# Altium footprint library aiskylab-14Connectors-19PWRCon.PcbLib: 63 footprints (part 1 of 4)
Each footprint in its own frame and in the unit in brackets; x right, y up, seen from the top. Pads: shape width x height; smd on the part's side, far side on the other; paste and mask are expansions set on the pad; w line width, h text height; cw(c..) or ccw(c..) is an arc to the next point about the centre after c.
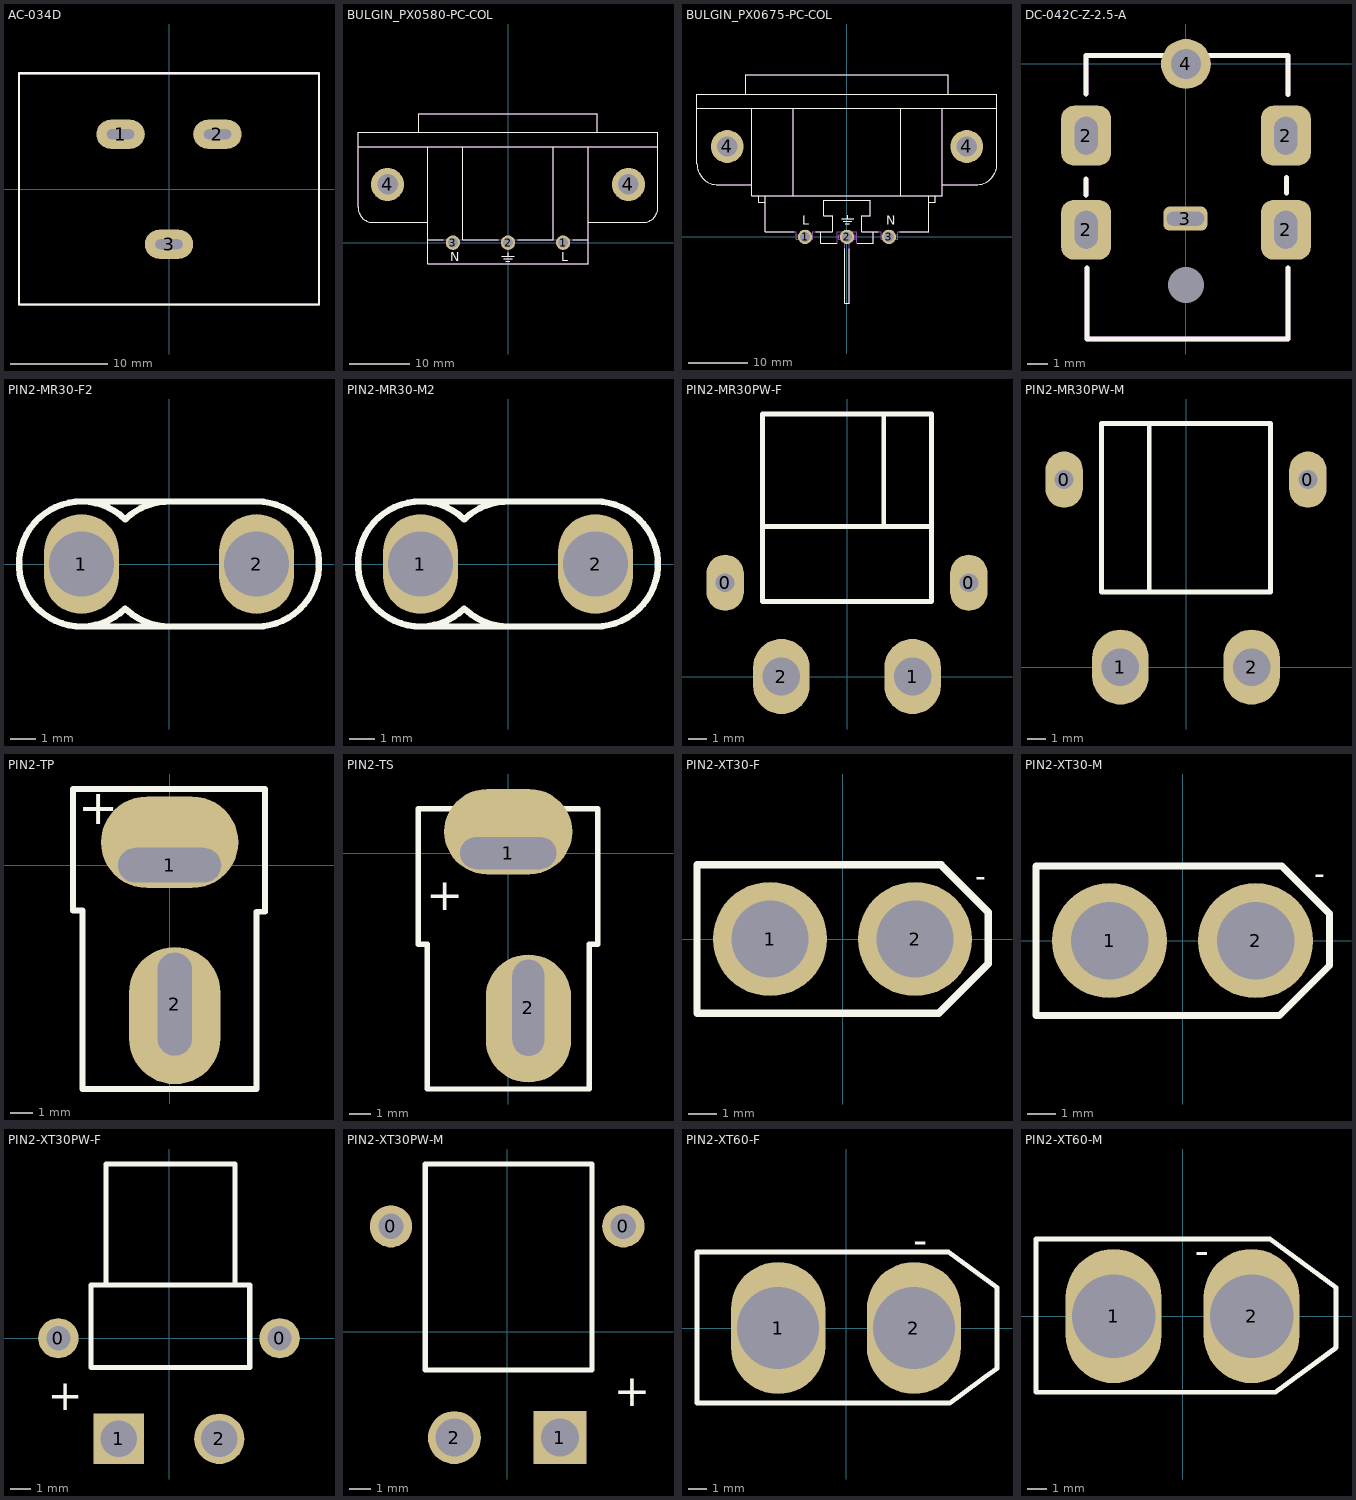
[diagram p0: the footprints below, top view; thin cyan lines are the x and y axes]

## AC-034D [mm]
pads (3):
  oval 5x3 hole 1 slot 2.8 at 0 deg: 1(-5,5.675) 2(5,5.675) 3(0,-5.675)
Top Overlay:
  lines w0.254: -15.469,-11.887 -15.469,11.963 15.469,11.963 15.469,-11.887 -15.469,-11.887
Top Designator:
  text ".Designator" at -7.618,-0.482 h1.52
Top Component Outline:
  lines w0.254: -15.469,-11.913 15.469,-11.913 15.469,11.963 -15.469,11.963 -15.469,-11.913
Top 3D Body:
  lines w0.254: -15.469,-11.913 -15.469,11.963 15.469,11.963 15.469,-11.913 -15.469,-11.913
3D body "ac-34d.stp": height 16.2, standoff -4.56, extent -15.45,-11.95 15.45,11.95

## BULGIN_PX0580-PC-COL [mm] "10A 250Vac PC Flange Rear Mount Inlet IEC Connector"
height 32.1
pads (5):
  round 2.4 hole 1.7: 1(9.14,0) 2(0,0) 3(-9.14,0)
  round 5.5 hole 3.4: 4(-20,9.65) 4(20,9.65)
Top Overlay:
  lines w0.2: -24.9,15.95 24.9,15.95 ; -14.785,18.35 -14.785,21.35 14.785,21.35 14.785,18.35 ; -13.3,0.45 -10.727,0.45 ; -13.3,3.35 -22.4,3.35 cw(c-22.4,5.85) -24.9,5.85 -24.9,18.35 24.9,18.35 24.9,5.85 cw(c22.4,5.85) 22.4,3.35 13.3,3.35 ; -13.3,15.95 -13.3,-3.55 13.3,-3.55 13.3,15.95 ; -7.553,0.45 -1.587,0.45 ; -7.539,0.45 -7.539,15.95 ; -1,-2.257 1,-2.257 ; -0.7,-2.657 0.7,-2.657 ; -0.4,-3.057 0.3,-3.057 ; 0,-2.257 0,-1.657 ; 1.587,0.45 7.553,0.45 ; 7.539,0.45 7.539,15.95 ; 10.727,0.45 13.3,0.45
  text "N" at -9.602,-3.075 h1.5
  text "L" at 8.843,-3.075 h1.5
Top Designator:
  text ".Designator" at -7.618,8.392 h1.52
Top Dimensions:
  lines w0.1: -21,9.65 -20,9.65 ; -20,8.65 -20,9.65 ; -20,10.65 -20,9.65 ; -19,9.65 -20,9.65 ; -10.14,0 -9.14,0 ; -9.14,-1 -9.14,0 ; -9.14,1 -9.14,0 ; -8.14,0 -9.14,0 ; -1,0 0,0 ; 0,-1 0,0 ; 0,1 0,0 ; 1,0 0,0 ; 8.14,0 9.14,0 ; 9.14,-1 9.14,0 ; 9.14,1 9.14,0 ; 10.14,0 9.14,0 ; 19,9.65 20,9.65 ; 20,8.65 20,9.65 ; 20,10.65 20,9.65 ; 21,9.65 20,9.65
Top 3D Body:
  circle w0.1: c20,9.65 r1.7
  circle w0.1: c-20,9.65 r1.7
  lines w0.1: -24.9,15.95 24.9,15.95 ; -14.785,18.35 -14.785,21.35 14.785,21.35 14.785,18.35 ; -13.3,0.45 13.3,0.45 ; -13.3,3.35 -22.4,3.35 cw(c-22.4,5.85) -24.9,5.85 -24.9,18.35 24.9,18.35 24.9,5.85 cw(c22.4,5.85) 22.4,3.35 13.3,3.35 ; -13.3,15.95 -13.3,-3.55 13.3,-3.55 13.3,15.95 ; -7.539,0.45 -7.539,15.95 ; -1,-2.257 1,-2.257 ; -0.7,-2.657 0.7,-2.657 ; -0.4,-3.057 0.3,-3.057 ; 0,-2.257 0,-1.657 ; 7.539,0.45 7.539,15.95
  text "N" at -9.602,-3.075 h1.5
  text "L" at 8.843,-3.075 h1.5
3D body "BULGIN_PX0580-PC-COL.stp": height 27.8, standoff -3.6, extent -24.9,-3.55 24.9,21.35
3D body "v240-170.stp": height 0.02, standoff -1.65, extent -1.2,-1.2 1.2,1.2
3D body "v240-170.stp": height 0.02, standoff -1.65, extent -10.34,-1.2 -7.94,1.2
3D body "v240-170.stp": height 0.02, standoff -1.65, extent 7.94,-1.2 10.34,1.2

## BULGIN_PX0675-PC-COL [mm] "10A 250Vac PC Flange Rear Mount Outlet IEC Connector"
height 30.4
pads (5):
  round 2.4 hole 1.7: 1(-7,0) 2(0,0) 3(7,0)
  round 5.5 hole 3.4: 4(-20,15.1) 4(20,15.1)
Top Overlay:
  lines w0.2: -25.05,21.5 25.05,21.5 ; -16.975,23.8 -16.95,23.825 -16.95,27.1 16.95,27.1 16.95,23.8 ; -15.9,8.7 -21.55,8.7 cw(c-21.55,12.2) -25.05,12.2 -25.05,23.8 25.05,23.8 25.05,12.2 cw(c21.55,12.2) 21.55,8.7 15.9,8.7 ; -15.9,21.5 -15.9,6.9 15.9,6.9 15.9,21.5 ; -14.775,6.9 -14.775,5.77 -13.65,5.77 ; -13.65,6.9 -13.65,0.9 -8.786,0.9 ; -5.214,0.9 -4.4,0.9 ; -1.67,-1.1 -4.4,-1.1 -4.4,0.9 ; -0.9,3 1.1,3 ; -0.6,2.6 0.8,2.6 ; -0.4,-1.96 -0.4,-11.1 0.4,-11.1 0.4,-1.96 ; -0.3,2.2 0.4,2.2 ; 0.1,3 0.1,3.6 ; 1.67,-1.1 4.4,-1.1 4.4,0.9 ; 5.214,0.9 4.4,0.9 ; 8.786,0.9 13.65,0.9 13.65,6.9 ; 9,6.9 9,21.5 ; 13.65,5.77 14.775,5.77 14.775,6.9 ; -4.4,0.9 -2.5,0.9 -2.5,3.5 -3.9,3.5 -3.9,6.1 3.9,6.1 3.9,3.5 2.5,3.5 2.5,0.9 4.4,0.9 ; -9,6.9 -9,21.5 -9,6.9
  text "L" at -7.47,2.055 h1.5
  text "N" at 6.53,2.055 h1.5
Top Designator:
  text ".Designator" at -7.618,7.492 h1.52
Top Dimensions:
  lines w0.1: -21,15.1 -20,15.1 ; -20,14.1 -20,15.1 ; -20,16.1 -20,15.1 ; -19,15.1 -20,15.1 ; -8,0 -7,0 ; -7,-1 -7,0 ; -7,1 -7,0 ; -6,0 -7,0 ; -1,0 0,0 ; 0,-1 0,0 ; 0,1 0,0 ; 1,0 0,0 ; 6,0 7,0 ; 7,-1 7,0 ; 7,1 7,0 ; 8,0 7,0 ; 19,15.1 20,15.1 ; 20,14.1 20,15.1 ; 20,16.1 20,15.1 ; 21,15.1 20,15.1
Top 3D Body:
  circle w0.1: c20,15.1 r1.7
  circle w0.1: c-20,15.1 r1.7
  lines w0.1: -25.05,21.5 25.05,21.5 ; -16.95,23.8 -16.95,27.1 16.95,27.1 16.95,23.8 ; -15.9,8.7 -21.55,8.7 cw(c-21.55,12.2) -25.05,12.2 -25.05,23.8 25.05,23.8 25.05,12.2 cw(c21.55,12.2) 21.55,8.7 15.9,8.7 ; -15.9,21.5 -15.9,6.9 15.9,6.9 15.9,21.5 ; -14.775,6.9 -14.775,5.77 -13.65,5.77 ; -13.65,6.9 -13.65,0.9 -8.5,0.9 -8.5,-0.4 -5.7,-0.4 -5.7,0.9 -4.4,0.9 ; -8.5,0.4 -5.7,0.4 ; -0.9,3 1.1,3 ; -0.6,2.6 0.8,2.6 ; -0.4,-0.4 -0.4,-11.1 0.4,-11.1 0.4,-0.4 ; -0.3,2.2 0.4,2.2 ; 0.1,3 0.1,3.6 ; 5.7,0.4 8.5,0.4 ; 9,6.9 9,21.5 ; 13.65,5.77 14.775,5.77 14.775,6.9 ; 13.65,6.9 13.65,0.9 8.5,0.9 8.5,-0.373 5.7,-0.373 5.7,0.9 4.4,0.9 ; -4.4,0.9 -2.5,0.9 -2.5,3.5 -3.9,3.5 -3.9,6.1 3.9,6.1 3.9,3.5 2.5,3.5 2.5,0.9 4.4,0.9 ; -4.4,0.9 -4.4,-1.1 -1.6,-1.1 -1.6,0.9 1.6,0.9 1.6,-1.1 4.4,-1.1 4.4,0.9 ; -9,6.9 -9,21.5 -9,6.9 ; -1.4,-0.4 1.4,-0.4 1.4,0.4 -1.4,0.4 -1.4,-0.4
  text "L" at -7.47,2.055 h1.5
  text "N" at 6.53,2.055 h1.5
3D body "v240-170.stp": height 0.02, standoff -1.65, extent -8.2,-1.2 -5.8,1.2
3D body "v240-170.stp": height 0.02, standoff -1.65, extent -1.2,-1.2 1.2,1.2
3D body "v240-170.stp": height 0.02, standoff -1.65, extent 5.8,-1.2 8.2,1.2
3D body "BULGIN_PX0675-PC-COL.stp": height 30.4, standoff -3.6, extent -25.05,-11.2 25.05,27.1

## DC-042C-Z-2.5-A [mm]
pads (7):
  rrect50% 2.5x3 hole 1.9 slot 1.15 at 0 deg: 2(-5,-8.306) 2(-5,-3.592) 2(5,-3.592) 2(5.004,-8.306)
  rrect50% 2.2x1.2 hole 0.7 slot 1.9 at 0 deg: 3(-0.025,-7.747)
  round 2.5 hole 1.5: 4(0,0)
  round 0 hole 1.8: #(0,-11.074)
Top Overlay:
  lines w0.254: -5,-6.55 -5,-5.775 ; -5,-1.492 -5,0.433 5.1,0.433 5.1,-1.517 ; -4.95,-10.217 -4.95,-13.767 5.1,-13.767 5.1,-10.217 ; 5.025,-6.45 5.025,-5.7
Top Designator:
  text ".Designator" at -7.616,-6.783 h1.52
Top Assembly:
  lines w0.254: -5,-6.558 -5,-5.783 ; -5,-1.5 -5,0.425 5.1,0.425 5.1,-1.525 ; -4.95,-10.225 -4.95,-13.775 5.1,-13.775 5.1,-10.225 ; 5.025,-6.458 5.025,-5.708
3D body "dc-042c-z-2_5-a.stp": height 9.95, standoff -1.95, extent -5,-13.817 5,0.533

## PIN2-MR30-F2 [mm]
height 24
pads (2):
  oval 3x4 hole 2.6: 1(-3.5,0) 2(3.5,0)
Top Overlay:
  lines w0.254: -3.5,-2.5 3.5,-2.5 ccw(c3.5,0) 3.5,2.5 -3.5,2.5 ; -1.754,1.781 cw(c0,0) -0.172,2.494 ; -1.75,1.785 ccw(c-3.5,0) -1.749,-1.784 ; -1.706,-1.828 ccw(c0,0) 0.055,-2.499
Top Designator:
  text ".Designator" at -7.621,-0.541 h1.52
3D body "MR30-F2.STEP": height 9.61, standoff -2.79, extent -6.153,-2.692 6.147,2.608

## PIN2-MR30-M2 [mm]
height 24
pads (2):
  oval 3x4 hole 2.6: 1(-3.5,0) 2(3.5,0)
Top Overlay:
  lines w0.254: -3.5,-2.5 3.5,-2.5 ccw(c3.5,0) 3.5,2.5 -3.5,2.5 ; -1.754,1.781 cw(c0,0) -0.172,2.494 ; -1.75,1.785 ccw(c-3.5,0) -1.749,-1.784 ; -1.706,-1.828 ccw(c0,0) 0.055,-2.499
Top Designator:
  text ".Designator" at -7.621,-0.541 h1.52
3D body "MR30-M2.STEP": height 10.51, standoff -2.89, extent -6.153,-2.692 6.147,2.608

## PIN2-MR30PW-F [mm]
height 24
pads (4):
  oval 2x3 hole 1: 0(-6.5,5) 0(6.5,5)
  oval 3x4 hole 2: 1(3.5,0) 2(-3.5,0)
Top Overlay:
  lines w0.254: -4.5,14 -4.5,4 4.5,4 4.5,14 ; -4.47,14 4.496,14 ; -4.445,8 4.47,8 ; 1.956,8 1.956,14
Top Designator:
  text ".Designator" at -7.643,5.505 h1.52
3D body "MR30PW-F.STEP": height 4.9, standoff -2.05, extent -7.675,-0.905 7.625,13.995

## PIN2-MR30PW-M [mm]
height 24
pads (4):
  oval 2x3 hole 1: 0(-6.5,10) 0(6.5,10)
  oval 3x4 hole 2: 1(-3.5,0) 2(3.5,0)
Top Overlay:
  lines w0.254: -4.5,4.013 -4.5,13 ; -4.496,4.008 4.5,4.008 4.5,13 ; -4.47,13 4.496,13 ; -1.981,13 cw(c-1.981,12.975) -1.956,12.975 -1.956,4.089
Top Designator:
  text ".Designator" at -7.613,5.005 h1.52
3D body "MR30PW-M.STEP": height 4.9, standoff -2.05, extent -7.645,-0.864 7.655,13.086

## PIN2-TP [mm]
height 18
pads (2):
  oval 6x4 hole 1.5 slot 4.5 at 0 deg copper offset 0,1 paste+0: 1(0,0)
  oval 4x6 hole 1.5 slot 4.5 at 90 deg copper offset 0,-0.5: 2(0.229,-6.071)
Top Overlay:
  lines w0.254: -3.8,-2.032 -3.8,-9.779 3.8,-9.779 3.8,-2.032 4.166,-2.032 4.166,3.327 -4.216,3.327 -4.216,-1.975 -3.8,-1.975
  text "+" at -3.988,1.778 h1.52
Bottom Overlay:
  text "+" at -2.972,1.803 h1.52
Top Designator:
  text ".Designator" at -7.643,-3.734 h1.52
3D body "AM-1015B-M.STEP": height 15.27, standoff -3.83, extent -4.333,-9.871 4.267,3.429

## PIN2-TS [mm]
height 18
pads (2):
  oval 6x4 hole 1.5 slot 4.5 at 0 deg copper offset 0,1 paste+0: 1(0,0)
  oval 4x6 hole 1.5 slot 4.5 at 90 deg copper offset 0,-0.5: 2(0.946,-7.251)
Top Overlay:
  lines w0.254: -4.216,-4.273 -4.216,2.077 4.191,2.077 4.191,-4.273 3.8,-4.273 3.8,-11.055 -3.8,-11.055 -3.8,-4.273 -4.216,-4.273
  text "+" at -3.835,-2.673 h1.52
Bottom Overlay:
  text "+" at -2.819,-2.648 h1.52
Top Designator:
  text ".Designator" at -7.63,-4.548 h1.52
3D body "AM-1015B-F.STEP": height 11.43, standoff -3.67, extent -4.325,-11.167 4.275,2.133

## PIN2-XT30-F [mm]
height 24
pads (2):
  round 4 hole 2.7: 1(-2.54,0) 2(2.54,0)
Top Overlay:
  lines w0.254: 3.454,2.6 -5.1,2.6 -5.1,-2.6 3.369,-2.6 5.105,-0.864 5.105,0.94 3.511,2.535
  text "-" at 4.648,1.829 h0.76
Bottom Overlay:
  text "+" at -4.88,-2.775 h0.51
  text "-" at 5.156,1.829 h0.76
Top Designator:
  text ".Designator" at -7.649,-0.539 h1.52
3D body "XT30U-F.STEP": height 9.4, standoff -3, extent -5.151,-2.831 5.049,2.769

## PIN2-XT30-M [mm]
height 24
pads (2):
  round 4 hole 2.7: 1(-2.54,0) 2(2.54,0)
Top Overlay:
  lines w0.254: 3.454,2.6 -5.1,2.6 -5.1,-2.6 3.369,-2.6 5.105,-0.864 5.105,0.94 3.511,2.535
  text "-" at 4.572,1.956 h0.76
Bottom Overlay:
  text "+" at -4.88,-2.775 h0.51
  text "-" at 5.08,1.956 h0.76
Top Designator:
  text ".Designator" at -7.674,-0.516 h1.52
3D body "XT30U-M.STEP": height 10.66, standoff -3.04, extent -5.176,-2.8 5.024,2.8

## PIN2-XT30PW-F [mm]
height 24
pads (4):
  round 2 hole 1.2: 0(-5.5,0) 0(5.5,0)
  rect 2.5x2.5 hole 1.8: 1(-2.5,-5)
  round 2.5 hole 1.8: 2(2.5,-5)
Top Overlay:
  lines w0.254: -3.124,2.642 -3.124,8.661 3.277,8.661 3.277,2.642 ; -3.886,-1.448 -3.886,2.642 4.013,2.642 4.013,-1.448 -3.886,-1.448
  text "+" at -6.02,-3.581 h1.52
Bottom Overlay:
  text "+" at -5.004,-3.505 h1.52
Top Designator:
  text ".Designator" at -7.643,0.815 h1.52
3D body "XT30PW-F.STEP": height 5.5, standoff -1.65, extent -6.675,-5.903 6.625,8.997

## PIN2-XT30PW-M [mm]
height 24
pads (4):
  round 2 hole 1.2: 0(-5.5,5) 0(5.5,5)
  rect 2.5x2.5 hole 1.8: 1(2.5,-5)
  round 2.5 hole 1.8: 2(-2.5,-5)
Top Overlay:
  lines w0.254: -3.886,-1.803 -3.886,7.95 4.013,7.95 4.013,-1.803 -3.886,-1.803
  text "+" at 5.055,-3.505 h1.52
Bottom Overlay:
  text "+" at 6.071,-3.505 h1.52
Top Designator:
  text ".Designator" at -7.617,0.355 h1.52
3D body "XT30PW-M.STEP": height 4.55, standoff -2.65, extent -6.65,-5.898 6.65,8.052

## PIN2-XT60-F [mm]
height 24
pads (2):
  oval 5x7 hole 4.35: 1(-3.6,0) 2(3.6,0)
Top Overlay:
  lines w0.254: -7.899,-3.975 5.499,-3.975 6.125,-3.517 7.376,-2.601 8.001,-2.143 8.001,2.143 5.43,4.025 -7.899,4.025 -7.899,-3.975
  text "-" at 3.556,3.937 h1.52
Bottom Overlay:
  text "-" at 4.572,3.937 h1.52
Top Designator:
  text ".Designator" at -7.567,-0.082 h1.52
3D body "XT60_F.STEP": height 16.8, standoff -4.5, extent -8.025,-4.011 7.975,4.089

## PIN2-XT60-M [mm]
height 24
pads (2):
  oval 5x7 hole 4.35: 1(-3.6,0) 2(3.6,0)
Top Overlay:
  lines w0.254: -7.645,-3.975 -7.645,4.025 4.551,4.025 8.001,1.5 8.001,-1.651 4.827,-3.975 -7.645,-3.975
  text "-" at 0.635,2.667 h1.52
Bottom Overlay:
  text "-" at 1.626,2.642 h1.52
Top Designator:
  text ".Designator" at -7.44,-0.482 h1.52
3D body "XT60 M.STEP": height 16.3, standoff -4.9, extent -7.772,-4.064 8.128,4.086